# Altium footprint library swatpcblib.PcbLib: 202 footprints (part 12 of 13)
Each footprint in its own frame and in the unit in brackets; x right, y up, seen from the top. Pads: shape width x height; smd on the part's side, far side on the other; paste and mask are expansions set on the pad; w line width, h text height; cw(c..) or ccw(c..) is an arc to the next point about the centre after c.
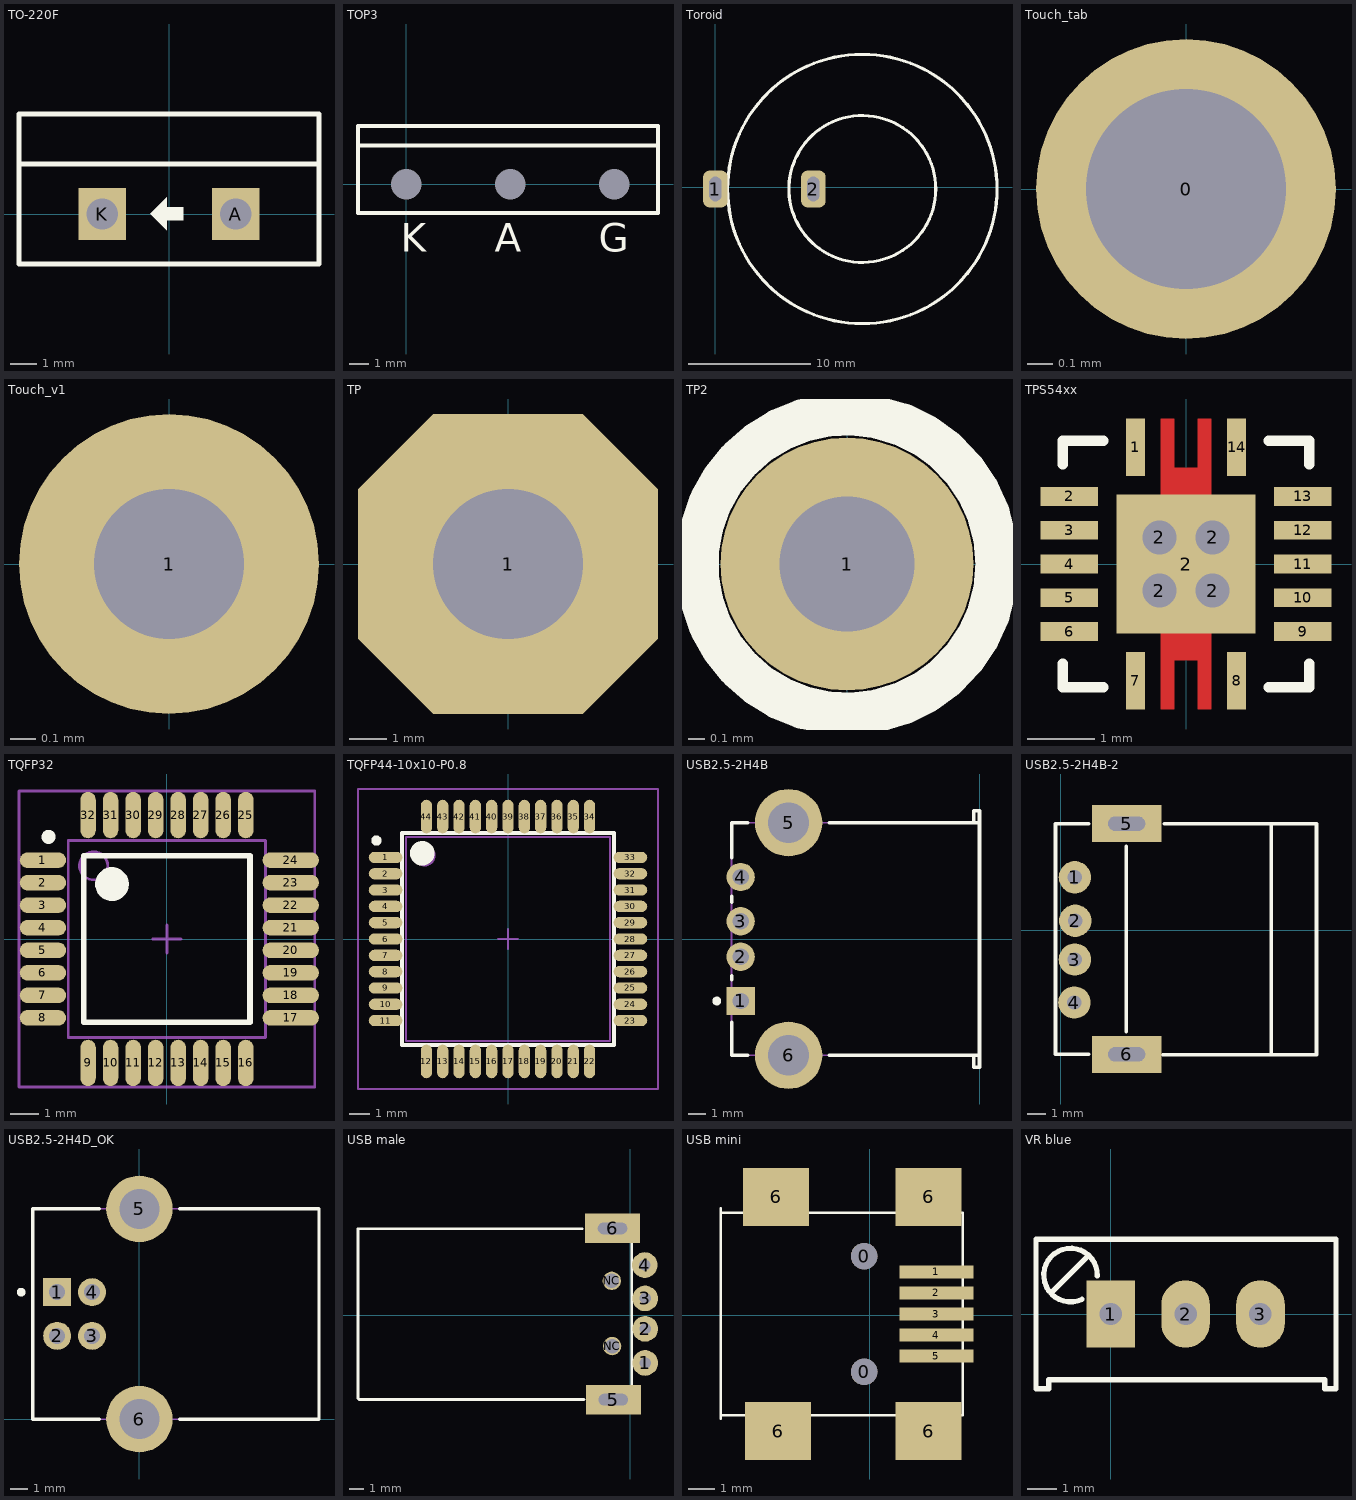
[diagram p11: the footprints below, top view; thin cyan lines are the x and y axes]

## TO-220F [mm]
pads (2):
  rect 1.8x2 hole 1.2: A(2.54,0) K(-2.54,0)
Top Overlay:
  region: -0.724,0.013 -0.089,-0.622 -0.089,-0.241 0.546,-0.241 0.546,0.267 -0.089,0.267 -0.089,0.648
  lines w0.2: -5.715,1.905 5.715,1.905 ; -5.715,-1.905 -5.715,2.54 -5.715,3.81 5.715,3.81 5.715,-1.905 -5.715,-1.905
3D body "User Library-TO-220-3.step": height 8.08, standoff -20.7, extent -4.925,-2.134 4.975,2.366

## TOP3 [mm] "SCR"
pads (3):
  round 0 / inner round 0 / far side oval 2.3x3 hole 1.6: A(5.45,0)
  round 0 / inner round 0 / far side rect 2.3x3 hole 1.6: G(10.9,0)
  rect 0x0 / inner rect 0x0 / far side oval 2.3x3 hole 1.6: K(0,0)
Top Overlay:
  lines w0.203: -2.54,2.032 13.208,2.032 ; -2.54,-1.524 13.208,-1.524 13.208,3.048 -2.54,3.048 -2.54,-1.524
  text "G" at 10.087,-3.559 h1.5
  text "A" at 4.637,-3.559 h1.5
  text "K" at -0.305,-3.559 h1.5
3D body "User Library-TOP3.step": height 29.9, standoff -6, extent -2.343,-1.397 13.157,3.103

## Toroid [mm]
pads (2):
  rrect50% 2x3 hole 1 slot 2 at 90 deg: 1(0,-0.127) 2(8,-0.127)
Top Overlay:
  circle w0.254: c12,-0.127 r11
  circle w0.254: c12,-0.127 r6
3D body "User Library-INDUCTOR - 2100HT series.STEP": height 11.43, standoff -12.7, extent 1.156,-10.971 23,10.873

## Touch_tab [mm]
pads (1):
  round 1.2 hole 0.8: 0(0,0)

## Touch_v1 [mm]
pads (1):
  round 1.2 hole 0.6: 1(0,0)

## TP [mm]
pads (1):
  oct 8x8 hole 4: 1(0,0)

## TP2 [mm]
pads (1):
  round 1.5 hole 0.8: 1(0,0)
Top Overlay:
  circle w0.254: c0,0 r0.889

## TPS54xx [mm]
pads (19):
  rect 0.28x0.85 smd paste-0.412: 1(-0.75,1.725) 7(-0.75,-1.725) 8(0.75,-1.725) 14(0.75,1.725)
  rect 0.85x0.28 smd paste-0.412: 2(-1.725,1) 3(-1.725,0.5) 4(-1.725,0) 5(-1.725,-0.5) 6(-1.725,-1) 9(1.725,-1) 10(1.725,-0.5) 11(1.725,0) 12(1.725,0.5) 13(1.725,1)
  round 0.5 hole 0.5: 2(-0.394,-0.394) 2(-0.394,0.394) 2(0.394,-0.394) 2(0.394,0.394)
  rect 2.05x2.05 smd paste-1.012 mask-1.012: 2(0,0)
Top Layer:
  region: -0.375,1.025 0.375,1.025 0.375,2.15 0.175,2.15 0.175,1.425 -0.175,1.425 -0.175,2.15 -0.375,2.15
  region: -0.375,-1.025 0.375,-1.025 0.375,-2.15 0.175,-2.15 0.175,-1.425 -0.175,-1.425 -0.175,-2.15 -0.375,-2.15
Top Overlay:
  lines w0.152: -1.825,-1.473 -1.825,-1.825 -1.223,-1.825 ; -1.825,1.473 -1.825,1.825 -1.223,1.825 ; 1.223,-1.825 1.825,-1.825 1.825,-1.473 ; 1.223,1.825 1.825,1.825 1.825,1.473
Top Paste:
  drawing of 27 lines, arcs and shapes, not listed
Top Solder:
  region: -1.23,1.21 -2.22,1.21 -2.22,0.79 -1.23,0.79
  region: -1.23,0.71 -2.22,0.71 -2.22,0.29 -1.23,0.29
  region: -1.23,0.21 -2.22,0.21 -2.22,-0.21 -1.23,-0.21
  region: -1.23,-0.29 -2.22,-0.29 -2.22,-0.71 -1.23,-0.71
  region: -1.23,-0.79 -2.22,-0.79 -2.22,-1.21 -1.23,-1.21
  region: -0.54,-1.23 -0.96,-1.23 -0.96,-2.22 -0.54,-2.22
  region: 0.96,-1.23 0.54,-1.23 0.54,-2.22 0.96,-2.22
  region: 2.22,-0.79 1.23,-0.79 1.23,-1.21 2.22,-1.21
  region: 2.22,-0.29 1.23,-0.29 1.23,-0.71 2.22,-0.71
  region: 2.22,0.21 1.23,0.21 1.23,-0.21 2.22,-0.21
  region: 2.22,0.71 1.23,0.71 1.23,0.29 2.22,0.29
  region: 2.22,1.21 1.23,1.21 1.23,0.79 2.22,0.79
  region: 0.96,2.22 0.54,2.22 0.54,1.23 0.96,1.23
  region: -0.54,2.22 -0.96,2.22 -0.96,1.23 -0.54,1.23
  region: -0.375,1.025 0.375,1.025 0.375,2.15 0.175,2.15 0.175,1.425 -0.175,1.425 -0.175,2.15 -0.375,2.15
  region: -0.375,-1.025 0.375,-1.025 0.375,-2.15 0.175,-2.15 0.175,-1.425 -0.175,-1.425 -0.175,-2.15 -0.375,-2.15
  region: -1.088,0.594 -1.088,1.088 1.088,1.088 1.088,0.594
  region: -1.088,-0.194 -1.088,0.194 1.088,0.194 1.088,-0.194
  region: -1.088,-1.088 -1.088,-0.594 1.088,-0.594 1.088,-1.088
  region: -1.088,-1.088 -1.088,1.088 -0.594,1.088 -0.594,-1.088
  region: 0.194,-1.088 0.194,1.088 -0.194,1.088 -0.194,-1.088
  region: 0.594,-1.088 0.594,1.088 1.088,1.088 1.088,-1.088
3D body "User Library-QFN-16_3x3.STEP": height 0.9, standoff 0, extent -1.473,-1.597 1.569,1.445

## TQFP32 [mm] "32-TQFP (7x7)"
pads (32):
  oval 1.65x0.55 smd: 1(-4.4,2.8) 2(-4.4,2) 3(-4.4,1.2) 4(-4.4,0.4) 5(-4.4,-0.4) 6(-4.4,-1.2) 7(-4.4,-2) 8(-4.4,-2.8)
  oval 0.55x1.65 smd: 9(-2.8,-4.4) 10(-2,-4.4) 11(-1.2,-4.4) 12(-0.4,-4.4) 13(0.4,-4.4) 14(1.2,-4.4) 15(2,-4.4) 16(2.8,-4.4) 25(2.8,4.4) 26(2,4.4) 27(1.2,4.4) 28(0.4,4.4) 29(-0.4,4.4) 30(-1.2,4.4) 31(-2,4.4) 32(-2.8,4.4)
  oval 2x0.55 smd: 17(4.4,-2.8) 18(4.4,-2) 19(4.4,-1.2) 20(4.4,-0.4) 21(4.4,0.4) 22(4.4,1.2) 23(4.4,2) 24(4.4,2.8)
Top Overlay:
  circle w0.25: c-4.2,3.625 r0.125
  circle w0.6: c-1.95,1.95 r0.3
  lines w0.2: -2.95,-2.95 -2.95,2.95 2.95,2.95 2.95,-2.95 -2.95,-2.95
Mechanical 13:
  circle w0.1: c-2.6,2.6 r0.5
  lines w0.1: -3.5,-3.5 -3.5,3.5 3.5,3.5 3.5,-3.5 -3.5,-3.5
Mechanical 15:
  lines w0.1: -0.5,0 0.5,0 ; 0,-0.5 0,0.5 ; -5.25,-5.25 -5.25,5.25 5.25,5.25 5.25,-5.25 -5.25,-5.25
3D body "User Library-PQFP_32_P0_8.STEP": height 1.6, standoff -0.05, extent -4.5,-4.496 4.5,4.504

## TQFP44-10x10-P0.8 [mm]
pads (44):
  oval 1.65x0.55 smd: 1(-6,4) 2(-6,3.2) 3(-6,2.4) 4(-6,1.6) 5(-6,0.8) 6(-6,0) 7(-6,-0.8) 8(-6,-1.6) 9(-6,-2.4) 10(-6,-3.2) 11(-6,-4) 23(6,-4) 24(6,-3.2) 25(6,-2.4) 26(6,-1.6) 27(6,-0.8) 28(6,0) 29(6,0.8) 30(6,1.6) 31(6,2.4) 32(6,3.2) 33(6,4)
  oval 0.55x1.65 smd: 12(-4,-6) 13(-3.2,-6) 14(-2.4,-6) 15(-1.6,-6) 16(-0.8,-6) 17(0,-6) 18(0.8,-6) 19(1.6,-6) 20(2.4,-6) 21(3.2,-6) 22(4,-6) 34(4,6) 35(3.2,6) 36(2.4,6) 37(1.6,6) 38(0.8,6) 39(0,6) 40(-0.8,6) 41(-1.6,6) 42(-2.4,6) 43(-3.2,6) 44(-4,6)
Top Overlay:
  circle w0.25: c-6.45,4.825 r0.125
  circle w0.6: c-4.2,4.2 r0.3
  lines w0.2: -5.2,-5.2 -5.2,5.2 5.2,5.2 5.2,-5.2 -5.2,-5.2
Mechanical 13:
  circle w0.1: c-4.1,4.1 r0.5
  lines w0.1: -5,-5 -5,5 5,5 5,-5 -5,-5
Mechanical 15:
  lines w0.1: -0.5,0 0.5,0 ; 0,-0.5 0,0.5 ; -7.35,-7.35 -7.35,7.35 7.35,7.35 7.35,-7.35 -7.35,-7.35
3D body "User Library-TQFP44-2.STEP": height 1.12, standoff -0.03, extent -6.024,-6.012 6,6.012

## USB2.5-2H4B [mm] "Connector; USB1.1, Type A, Thru-Hole; 4 Position; Right Angle"
height 7.01
pads (6):
  rect 1.6x1.6 hole 0.92: 1(-13.49,-3.5)
  round 1.6 hole 0.92: 2(-13.49,-1) 3(-13.49,1) 4(-13.49,3.5)
  round 3.8 hole 2.3: 5(-10.78,6.57) 6(-10.78,-6.57)
Top Overlay:
  circle w0.25: c-14.84,-3.5 r0.125
  lines w0.2: -14,-4.7 -14,-6.565 -13.08,-6.565 ; -14,-2.3 -14,-2.09 ; -14,2.09 -14,2.41 ; -14,4.59 -14,6.565 -13.08,6.565 ; -8.48,-6.565 0,-6.565 ; -8.48,6.565 0,6.565 ; -0.32,-6.565 -0.32,-7.25 0,-7.25 0,-6.565 ; -0.32,6.565 -0.32,7.25 0,7.25 0,6.565 ; 0,-6.565 0,6.565
Mechanical 13:
  lines w0.1: -14,-6.565 -0.32,-6.565 -0.32,-7.25 0,-7.25 0,7.25 -0.32,7.25 -0.32,6.565 -14,6.565 -14,-6.565
3D body: height 7.01, standoff 0, extent -13.999,-7.249 -0.001,7.249

## USB2.5-2H4B-2 [mil]
pads (6):
  round 70 hole 31: 1(30,115) 2(31,21) 3(30,-63) 4(29,-156)
  rect 150x80 hole 31 slot 80 at 0 deg: 5(142,231) 6(142,-268)
Top Overlay:
  lines w8: 60,-268 -12,-268 -12,231 60,231 ; 141,-219 141,182 ; 220,-269 548,-269 553,-269 553,-249 ; 224,231 553,231 553,-264 ; 455,-269 455,229
3D body "Samtec-USB-A-S-F-B-TH.STEP": height 101.33, standoff -328.74, extent -2.56,-326.99 552.56,295.02

## USB2.5-2H4D_OK [mm] "onnector; USB1.1, Type B, Thru-Hole; 4 Position; Right Angle"
height 11.1
pads (6):
  rect 1.6x1.6 hole 0.92: 1(-4.71,7.27)
  round 1.6 hole 0.92: 2(-4.71,4.77) 3(-2.71,4.77) 4(-2.71,7.27)
  round 3.8 hole 2.3: 5(0,12.04) 6(0,0)
Top Overlay:
  circle w0.25: c-6.77,7.27 r0.125
  lines w0.2: -2.3,0 -6.12,0 -6.12,12.04 -2.3,12.04 ; 2.3,0 10.28,0 10.28,12.04 2.3,12.04
Mechanical 13:
  lines w0.1: -6.12,0 10.28,0 10.28,12.04 -6.12,12.04 -6.12,0
3D body: height 11.1, standoff 0, extent -6.12,0 10.28,12.04

## USB male [mil]
pads (8):
  round 70 hole 31: 1(40,-130) 2(40,-37) 3(40,46) 4(39,137)
  rect 150x80 hole 31 slot 80 at 0 deg: 5(-47,-230) 6(-49,237)
  round 50 hole 40: NC(-51,94) NC(-50,-84)
Top Overlay:
  lines w7: 3,-248 3,251
  lines w8: -132,236 -743,236 -743,-227 -740,-230 -127,-230
3D body "Samtec3dPS-USB-AM.STEP": height 177.95, standoff -46.46, extent -744.58,-241.06 44,251.06

## USB mini [mm]
pads (11):
  round 1 hole 1: 0(-0.21,-2.149) 0(-0.21,2.251)
  rect 2.8x0.5 smd: 1(2.54,1.651) 2(2.54,0.851) 3(2.54,0.051) 4(2.54,-0.749) 5(2.54,-1.549)
  rect 2.5x2.2 smd: 6(-3.556,4.501) 6(-3.48,-4.399) 6(2.24,-4.399) 6(2.24,4.501)
Top Overlay:
  lines w0.1: -5.66,-3.936 -5.66,4.064 ; -5.66,-3.799 3.54,-3.799 3.54,3.901 -5.66,3.901
3D body "SW3dPS-USB_mini_B.STEP": height 3.95, standoff -1, extent -6.179,-5.249 3.021,5.451

## VR blue [mil] "Bien tro tinh"
pads (3):
  rect 65x90 hole 30: 1(0,0)
  oval 65x90 hole 30: 2(100,0) 3(200,0)
Top Overlay:
  lines w7: -80,28 -30,78 ; -38.6,19.63 cw(c-53.79,52.05) -18.01,50.77 ; -100,-100 -100,100 301,100 301,-100 286,-100 286,-88 -83,-88 -83,-100 -100,-100
3D body "SW3dPS-Bourns_3299W.STEP": height 455, standoff -45, extent -87.5,-75 287.5,165